# Altium footprint library custom.PcbLib: 317 footprints (part 2 of 20)
Each footprint in its own frame and in the unit in brackets; x right, y up, seen from the top. Pads: shape width x height; smd on the part's side, far side on the other; paste and mask are expansions set on the pad; w line width, h text height; cw(c..) or ccw(c..) is an arc to the next point about the centre after c.
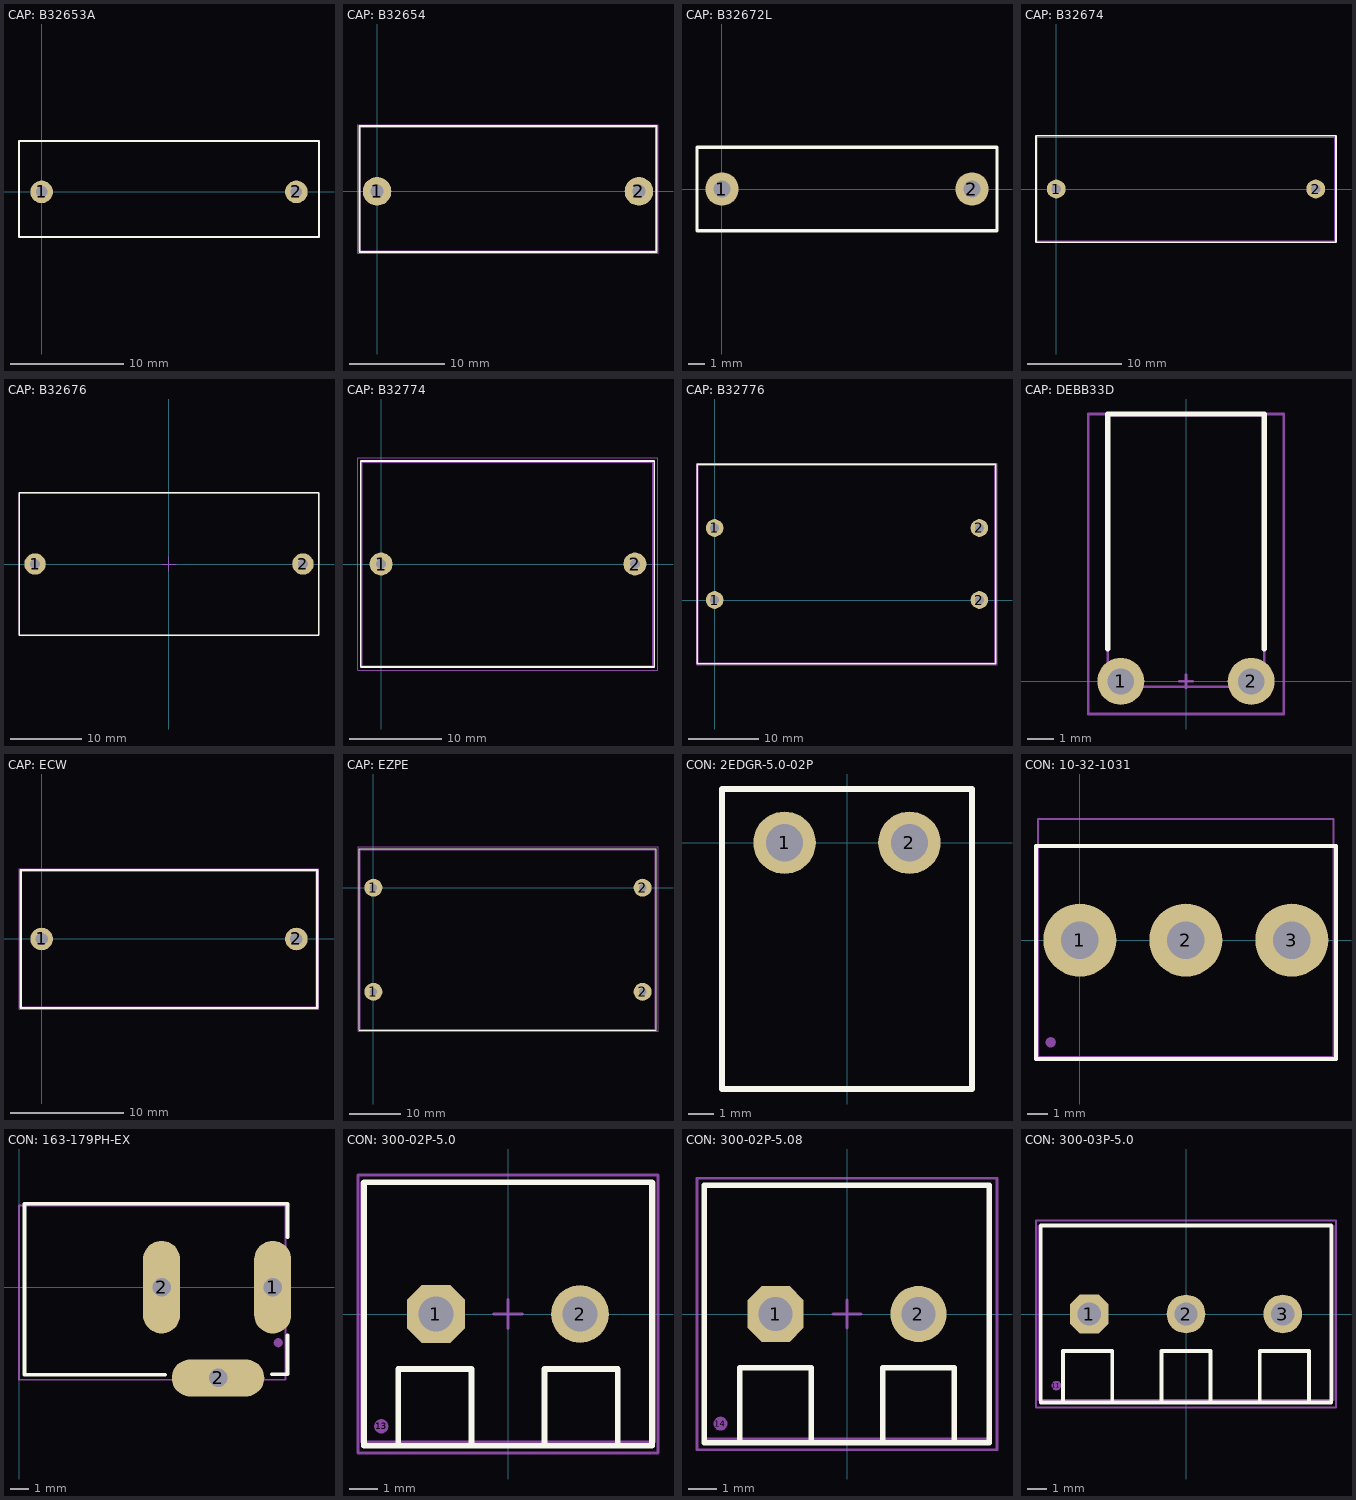
[diagram p1: the footprints below, top view; thin cyan lines are the x and y axes]

## CAP: B32653A [mm]
pads (2):
  round 2 hole 1: 1(0,0) 2(22.5,0)
Top Overlay:
  lines w0.2: -2,-4 -2,4.5 24.5,4.5 24.5,-4 -2,-4
Top Assy:
  lines w0.1: -2,-4 -2,4.5 24.5,4.5 24.5,-4 -2,-4
Size Area:
  lines w0.1: -2,-4 -2,4.5 24.5,4.5 24.5,-4 -2,-4
3D body "6.STEP": height 16.5, standoff -2.5, extent -2,-4 24.5,4.5

## CAP: B32654 [mm]
pads (2):
  round 3 hole 1.4: 1(0,0) 2(27.5,0)
Top Overlay:
  lines w0.2: -1.85,-6.35 -1.85,6.85 29.35,6.85 29.35,-6.35 -1.85,-6.35
Top Assy:
  lines w0.1: -1.75,-6.25 -1.75,6.75 29.25,6.75 29.25,-6.25 -1.75,-6.25
Size Area:
  lines w0.1: -2,-6.5 29.5,-6.5 29.5,7 -2,7 -2,-6.5
3D body "User Library-Vishay_1uF-400V_MKT_373_STD_27_5pitch.STEP": height 23, standoff -3, extent -1.75,-6.25 29.25,6.75

## CAP: B32672L [mm]
pads (2):
  round 2 hole 1: 1(0,0) 2(15,0)
Top Overlay:
  lines w0.2: -1.5,-2.5 16.5,-2.5 16.5,2.5 -1.5,2.5 -1.5,-2.5
Top Assy:
  lines w0.1: -1.5,-2.5 -1.5,2.5 16.5,2.5 16.5,-2.5 -1.5,-2.5
Size Area:
  lines w0.1: -1.5,-2.5 -1.5,2.5 16.5,2.5 16.5,-2.5 -1.5,-2.5
3D body "5.STEP": height 10.5, standoff -2.5, extent -1.5,-2.5 16.5,2.5

## CAP: B32674 [mm]
pads (2):
  round 2 hole 1: 1(0,0) 2(27.5,0)
Top Overlay:
  lines w0.2: -2.15,-5.65 29.65,-5.65 29.65,5.65 -2.15,5.65 -2.15,-5.65
Top Assy:
  lines w0.1: -2,-5.5 -2,5.5 29.5,5.5 29.5,-5.5 -2,-5.5
Size Area:
  lines w0.1: -2,-5.5 -2,5.5 29.5,5.5 29.5,-5.5 -2,-5.5
3D body "B32674.STEP": height 19, standoff -3, extent -2,-5.5 29.5,5.5

## CAP: B32676 [mm]
pads (2):
  round 3 hole 1.4: 1(-18.75,0) 2(18.75,0)
Top Overlay:
  lines w0.2: -21,-10 -21,10 21,10 21,-10 -21,-10
Top Assy:
  lines w0.1: -21,-10 21,-10 21,10 -21,10 -21,-10
Size Area:
  lines w0.1: -1,0 1,0 ; 0,-1 0,1 ; -21,-10 21,-10 21,10 -21,10 -21,-10
3D body "B32676.STEP": height 39.55, standoff -3, extent -21,-10 21,10

## CAP: B32774 [mm]
pads (2):
  round 2.5 hole 1.1: 1(0,0) 2(27.5,0)
Top Overlay:
  lines w0.2: -2.2,-11.15 -2.2,11.15 29.6,11.15 29.6,-11.15 -2.2,-11.15
Top Assy:
  lines w0.1: -2.05,-11 -2.05,11 29.45,11 29.45,-11 -2.05,-11
Size Area:
  lines w0.1: -2.5,-11.5 30,-11.5 30,11.5 -2.5,11.5 -2.5,-11.5
3D body "CAPRR2750W80L3150T2200H3650.STEP": height 36, standoff -2.6, extent -2.05,-11 29.45,11

## CAP: B32776 [mm]
pads (4):
  round 2.5 hole 1.3: 1(0,0) 1(0,10.2) 2(37.5,0) 2(37.5,10.2)
Top Overlay:
  lines w0.2: -2.45,-9.05 39.85,-9.05 39.85,19.25 -2.45,19.25 -2.45,-9.05
Top Assy:
  lines w0.1: -2.3,-8.9 39.7,-8.9 39.7,19.1 -2.3,19.1 -2.3,-8.9
Size Area:
  lines w0.1: -2.5,-9.2 -2.5,19.4 40,19.4 40,-9.2 -2.5,-9.2
3D body "CAPRR3750W120L4200T2800H3700P1020.STEP": height 36.5, standoff -2.6, extent -2.3,-8.9 39.7,19.1

## CAP: DEBB33D [mm]
pads (3):
  round 1.8 hole 1: 1(-2.5,0) 2(2.5,0)
  round 0.5 on Mech1: ""(-2.5,0.25)
Top Overlay:
  lines w0.2: -3,1.25 -3,10.25 3,10.25 3,1.25
Top Assy:
  lines w0.1: -3,-0.2 -3,10.2 3,10.2 3,-0.2 -3,-0.2
Size Area:
  lines w0.1: -0.25,0 0.25,0 ; 0,-0.25 0,0.25 ; -3.75,-1.25 -3.75,10.25 3.75,10.25 3.75,-1.25 -3.75,-1.25
3D body "DEBB33D_90.STEP": height 4.02, standoff -1.98, extent -3,-0.2 3,10.2

## CAP: ECW [mm]
pads (2):
  round 2 hole 1.1: 1(0,0) 2(22.5,0)
Top Overlay:
  lines w0.2: -1.85,-6.1 -1.85,6.1 24.35,6.1 24.35,-6.1 -1.85,-6.1
Top Assy:
  lines w0.1: 24.25,-6 -1.75,-6 -1.75,6 24.25,6 24.25,-6 ; 24.25,-6 24.25,-6 ; 24.25,-6 24.25,-6
Size Area:
  lines w0.1: -2,-6.2 -2,6.2 24.5,6.2 24.5,-6.2 -2,-6.2
3D body "ECW Series.stp": height 19.05, standoff -2.5, extent -1.75,-6 24.25,6

## CAP: EZPE [mm]
pads (4):
  round 3.5 hole 1.5: 1(0,-20.3) 1(0,0) 2(52.5,-20.3) 2(52.5,0)
Top Overlay:
  lines w0.2: -2.75,-27.8 55.15,-27.8 55.15,7.625 -2.75,7.625 -2.75,-27.8
Top Assy:
  lines w0.2: -2.55,-27.6 54.95,-27.6 54.95,7.41 -2.55,7.41 -2.55,-27.6
Size Area:
  lines w0.1: -3,-28 55.5,-28 55.5,8 -3,8 -3,-28
3D body "EZPE50170MTA.stp": height 56.05, standoff -4, extent -2.55,-27.6 54.95,7.41

## CON: 2EDGR-5.0-02P [mm] "Green connector"
pads (2):
  round 2.5 hole 1.5: 1(-2.5,0) 2(2.5,0)
Top Overlay:
  lines w0.254: -5,-9.85 -5,2.15 5,2.15 5,-9.85 -5,-9.85
3D body "2EDGR-5.0-02P-14-00AH.SLDPRT": height 8.4, standoff -3.3, extent -5,-9.85 5,2.15

## CON: 10-32-1031 [mm]
pads (4):
  round 3.5 hole 1.8: 1(0,0) 2(5.08,0) 3(10.16,0)
  round 0.5 on Mech1: ""(-1.4,-4.9)
Top Overlay:
  lines w0.2: -2.1,-5.7 -2.1,4.5 12.275,4.5 12.275,-5.7 11.8,-5.7 -2.1,-5.7
Top Assy:
  lines w0.1: -2,-5.6 12.16,-5.6 12.16,5.8 -2,5.8 -2,-5.6
3D body "010321031.stp": height 13.85, standoff -3.6, extent -2,-5.6 12.16,5.8

## CON: 163-179PH-EX [mm]
pads (4):
  oval 2x5 hole 1 square: 1(13.7,0) 2(7.7,0)
  oval 5x2 hole 1 square: 2(10.75,-4.9)
  round 0.5 on Mech1: ""(14,-3)
Top Overlay:
  lines w0.2: 7.9,-4.725 0.3,-4.725 0.3,4.5 14.5,4.5 14.5,2.7 ; 13.65,-4.7 14.5,-4.7 14.5,-2.6
Top Assy:
  lines w0.1: 0,-5 0,4.4 14.4,4.4 14.4,-5 0,-5
3D body "User Library-PJ-002AH.STEP": height 11.05, standoff -3.45, extent 0,-5 14.4,4.4

## CON: 300-02P-5.0 [mm] "2 pin 5.08mm screw connector"
height 12.5
pads (3):
  oct 2x2 hole 1.2: 1(-2.5,0)
  round 2 hole 1.2: 2(2.5,0)
  round 0.5 on Mech1: 13(-4.4,-3.9)
Top Overlay:
  lines w0.2: -3.81,-4.572 -3.81,-1.905 -1.27,-1.905 -1.27,-4.445 ; 1.27,-4.572 1.27,-1.905 3.81,-1.905 3.81,-4.445 ; -5,-4.572 5,-4.572 5,4.572 -5,4.572 -5,-4.572
Top Assy:
  lines w0.1: -5.08,-4.445 -5.08,4.555 5.08,4.555 5.08,-4.445 -5.08,-4.445
Size Area:
  lines w0.1: -0.5,0 0.5,0 ; 0,-0.5 0,0.5 ; -5.207,-4.826 5.207,-4.826 5.207,4.826 -5.207,4.826 -5.207,-4.826
3D body "300-02.STEP": height 12.5, standoff -4, extent -5.08,-4.445 5.08,4.555

## CON: 300-02P-5.08 [mm] "2 pin 5.08mm screw connector"
height 12.5
pads (3):
  oct 2x2 hole 1.2: 1(-2.54,0)
  round 2 hole 1.2: 2(2.54,0)
  round 0.5 on Mech1: 14(-4.5,-3.9)
Top Overlay:
  lines w0.2: -3.81,-4.572 -3.81,-1.905 -1.27,-1.905 -1.27,-4.445 ; 1.27,-4.572 1.27,-1.905 3.81,-1.905 3.81,-4.445 ; -5.08,-4.572 5.063,-4.572 5.063,4.572 -5.08,4.572 -5.08,-4.572
Top Assy:
  lines w0.1: -5.08,-4.445 -5.08,4.555 5.08,4.555 5.08,-4.445 -5.08,-4.445
Size Area:
  lines w0.1: -0.5,0 0.5,0 ; 0,-0.5 0,0.5 ; -5.334,-4.826 5.334,-4.826 5.334,4.826 -5.334,4.826 -5.334,-4.826
3D body "300-02.STEP": height 12.5, standoff -4, extent -5.08,-4.445 5.08,4.555

## CON: 300-03P-5.0 [mm] "3 pin 5.08mm screw connector"
height 12.5
pads (4):
  oct 2x2 hole 1.2: 1(-5,0)
  round 2 hole 1.2: 2(0,0) 3(5,0)
  round 0.5 on Mech1: 11(-6.7,-3.7)
Top Overlay:
  lines w0.2: -6.35,-4.572 -6.35,-1.905 -3.81,-1.905 -3.81,-4.445 ; -1.27,-4.572 -1.27,-1.905 1.27,-1.905 1.27,-4.445 ; 3.81,-4.572 3.81,-1.905 6.35,-1.905 6.35,-4.445 ; -7.5,-4.572 -7.5,4.572 7.5,4.572 7.5,-4.572 -7.5,-4.572
Top Assy:
  lines w0.1: -7.62,-4.445 7.62,-4.445 7.62,4.555 -7.62,4.555 -7.62,-4.445
Size Area:
  lines w0.1: -0.5,0 0.5,0 ; 0,-0.5 0,0.5 ; -7.747,-4.826 -7.747,4.826 7.747,4.826 7.747,-4.826 -7.747,-4.826
3D body "300-03.STEP": height 12.5, standoff -4, extent -7.62,-4.445 7.62,4.555